# Altium schematic symbol library jlcpcb_2025_04_capacitors_extended_0603.schlib: 3668 symbols (part 6 of 20) (continued)
## AC0603KRX7R8BB222
designator C?  Capacitance: 2.2nF  (hidden comment: *)
Capacitor, Ceramic (MLCC), 2.2nF, ±10%, 25V, X7R, ±10%, SMD 0603; Manufacturer: YAGEO; Manufacturer Part Number: AC0603KRX7R8BB222; Package Size: 0603; JLCPCB Basic Part: No; JLCPCB Part Number: C3863730; Supplier 1: LCSC; Category: Capacitors - MLCC; Supplier Part Number 1: C3863730; Tolerance: ±10%; Voltage Rating: 25V; Temperature Coefficient: X7R; RoHS: Yes; ComponentLink1Description: Datasheet; ComponentLink1URL: https://wmsc.lcsc.com/wmsc/upload/file/pdf/v2/lcsc/2311211113_YAGEO-AC0603KRX7R8BB222_C3863730.pdf; ComponentLink2Description: JLCPCB Part URL; ComponentLink2URL: https://jlcpcb.com/partdetail/C3863730; ComponentLink3Description: LCSC Part URL; ComponentLink3URL: https://lcsc.com/product-detail/Multilayer-Ceramic-Capacitors-MLCC---SMD-SMT_YAGEO-YAGEO-AC0603KRX7R8BB222_C3863730.html
footprint CAP-0603 (0603 (1608M) Capacitor)
pins: 1, 2

## AC0603KRX7R8BB223
designator C?  Capacitance: 22nF  (hidden comment: *)
Capacitor, Ceramic (MLCC), 22nF, ±10%, 25V, X7R, ±10%, SMD 0603; Manufacturer: YAGEO; Manufacturer Part Number: AC0603KRX7R8BB223; Package Size: 0603; JLCPCB Basic Part: No; JLCPCB Part Number: C2180126; Supplier 1: LCSC; Category: Capacitors - MLCC; Supplier Part Number 1: C2180126; Tolerance: ±10%; Voltage Rating: 25V; Temperature Coefficient: X7R; RoHS: Yes; ComponentLink1Description: Datasheet; ComponentLink1URL: https://wmsc.lcsc.com/wmsc/upload/file/pdf/v2/lcsc/2202041100_YAGEO-AC0603KRX7R8BB223_C2180126.pdf; ComponentLink2Description: JLCPCB Part URL; ComponentLink2URL: https://jlcpcb.com/partdetail/C2180126; ComponentLink3Description: LCSC Part URL; ComponentLink3URL: https://lcsc.com/product-detail/Multilayer-Ceramic-Capacitors-MLCC---SMD-SMT_YAGEO-YAGEO-AC0603KRX7R8BB223_C2180126.html
footprint CAP-0603 (0603 (1608M) Capacitor)
pins: 1, 2

## AC0603KRX7R8BB224
designator C?  Capacitance: 220nF  (hidden comment: *)
Capacitor, Ceramic (MLCC), 220nF, ±10%, 25V, X7R, ±10%, SMD 0603; Manufacturer: YAGEO; Manufacturer Part Number: AC0603KRX7R8BB224; Package Size: 0603; JLCPCB Basic Part: No; JLCPCB Part Number: C726561; Supplier 1: LCSC; Category: Capacitors - MLCC; Supplier Part Number 1: C726561; Tolerance: ±10%; Voltage Rating: 25V; Temperature Coefficient: X7R; RoHS: Yes; ComponentLink1Description: Datasheet; ComponentLink1URL: https://wmsc.lcsc.com/wmsc/upload/file/pdf/v2/lcsc/2009181007_YAGEO-AC0603KRX7R8BB224_C726561.pdf; ComponentLink2Description: JLCPCB Part URL; ComponentLink2URL: https://jlcpcb.com/partdetail/C726561; ComponentLink3Description: LCSC Part URL; ComponentLink3URL: https://lcsc.com/product-detail/Multilayer-Ceramic-Capacitors-MLCC---SMD-SMT_YAGEO-YAGEO-AC0603KRX7R8BB224_C726561.html
footprint CAP-0603 (0603 (1608M) Capacitor)
pins: 1, 2

## AC0603KRX7R8BB472
designator C?  Capacitance: 4.7nF  (hidden comment: *)
Capacitor, Ceramic (MLCC), 4.7nF, ±10%, 25V, X7R, ±10%, SMD 0603; Manufacturer: YAGEO; Manufacturer Part Number: AC0603KRX7R8BB472; Package Size: 0603; JLCPCB Basic Part: No; JLCPCB Part Number: C2180916; Supplier 1: LCSC; Category: Capacitors - MLCC; Supplier Part Number 1: C2180916; Tolerance: ±10%; Voltage Rating: 25V; Temperature Coefficient: X7R; RoHS: Yes; ComponentLink1Description: Datasheet; ComponentLink1URL: https://wmsc.lcsc.com/wmsc/upload/file/pdf/v2/lcsc/2202041200_YAGEO-AC0603KRX7R8BB472_C2180916.pdf; ComponentLink2Description: JLCPCB Part URL; ComponentLink2URL: https://jlcpcb.com/partdetail/C2180916; ComponentLink3Description: LCSC Part URL; ComponentLink3URL: https://lcsc.com/product-detail/Multilayer-Ceramic-Capacitors-MLCC---SMD-SMT_YAGEO-YAGEO-AC0603KRX7R8BB472_C2180916.html
footprint CAP-0603 (0603 (1608M) Capacitor)
pins: 1, 2

## AC0603KRX7R8BB473
designator C?  Capacitance: 47nF  (hidden comment: *)
Capacitor, Ceramic (MLCC), 47nF, ±10%, 25V, X7R, ±10%, SMD 0603; Manufacturer: YAGEO; Manufacturer Part Number: AC0603KRX7R8BB473; Package Size: 0603; JLCPCB Basic Part: No; JLCPCB Part Number: C726562; Supplier 1: LCSC; Category: Capacitors - MLCC; Supplier Part Number 1: C726562; Tolerance: ±10%; Voltage Rating: 25V; Temperature Coefficient: X7R; RoHS: Yes; ComponentLink1Description: Datasheet; ComponentLink1URL: https://wmsc.lcsc.com/wmsc/upload/file/pdf/v2/lcsc/2010041434_YAGEO-AC0603KRX7R8BB473_C726562.pdf; ComponentLink2Description: JLCPCB Part URL; ComponentLink2URL: https://jlcpcb.com/partdetail/C726562; ComponentLink3Description: LCSC Part URL; ComponentLink3URL: https://lcsc.com/product-detail/Multilayer-Ceramic-Capacitors-MLCC---SMD-SMT_YAGEO-YAGEO-AC0603KRX7R8BB473_C726562.html
footprint CAP-0603 (0603 (1608M) Capacitor)
pins: 1, 2

## AC0603KRX7R9BB102
designator C?  Capacitance: 1nF  (hidden comment: *)
Capacitor, Ceramic (MLCC), 1nF, ±10%, 50V, X7R, ±10%, SMD 0603; Manufacturer: YAGEO; Manufacturer Part Number: AC0603KRX7R9BB102; Package Size: 0603; JLCPCB Basic Part: No; JLCPCB Part Number: C277475; Supplier 1: LCSC; Category: Capacitors - MLCC; Supplier Part Number 1: C277475; Tolerance: ±10%; Voltage Rating: 50V; Temperature Coefficient: X7R; RoHS: Yes; ComponentLink1Description: Datasheet; ComponentLink1URL: https://wmsc.lcsc.com/wmsc/upload/file/pdf/v2/lcsc/2304140030_YAGEO-AC0603KRX7R9BB102_C277475.pdf; ComponentLink2Description: JLCPCB Part URL; ComponentLink2URL: https://jlcpcb.com/partdetail/C277475; ComponentLink3Description: LCSC Part URL; ComponentLink3URL: https://lcsc.com/product-detail/Multilayer-Ceramic-Capacitors-MLCC---SMD-SMT_YAGEO-YAGEO-AC0603KRX7R9BB102_C277475.html
footprint CAP-0603 (0603 (1608M) Capacitor)
pins: 1, 2

## AC0603KRX7R9BB103
designator C?  Capacitance: 10nF  (hidden comment: *)
Capacitor, Ceramic (MLCC), 10nF, ±10%, 50V, X7R, ±10%, SMD 0603; Manufacturer: YAGEO; Manufacturer Part Number: AC0603KRX7R9BB103; Package Size: 0603; JLCPCB Basic Part: No; JLCPCB Part Number: C149618; Supplier 1: LCSC; Category: Capacitors - MLCC; Supplier Part Number 1: C149618; Tolerance: ±10%; Voltage Rating: 50V; Temperature Coefficient: X7R; RoHS: Yes; ComponentLink1Description: Datasheet; ComponentLink1URL: https://wmsc.lcsc.com/wmsc/upload/file/pdf/v2/lcsc/2304140030_YAGEO-AC0603KRX7R9BB103_C149618.pdf; ComponentLink2Description: JLCPCB Part URL; ComponentLink2URL: https://jlcpcb.com/partdetail/C149618; ComponentLink3Description: LCSC Part URL; ComponentLink3URL: https://lcsc.com/product-detail/Multilayer-Ceramic-Capacitors-MLCC---SMD-SMT_YAGEO-YAGEO-AC0603KRX7R9BB103_C149618.html
footprint CAP-0603 (0603 (1608M) Capacitor)
pins: 1, 2

## AC0603KRX7R9BB104
designator C?  Capacitance: 100nF  (hidden comment: *)
Capacitor, Ceramic (MLCC), 100nF, ±10%, 50V, X7R, ±10%, SMD 0603; Manufacturer: YAGEO; Manufacturer Part Number: AC0603KRX7R9BB104; Package Size: 0603; JLCPCB Basic Part: No; JLCPCB Part Number: C149620; Supplier 1: LCSC; Category: Capacitors - MLCC; Supplier Part Number 1: C149620; Tolerance: ±10%; Voltage Rating: 50V; Temperature Coefficient: X7R; RoHS: Yes; ComponentLink1Description: Datasheet; ComponentLink1URL: https://wmsc.lcsc.com/wmsc/upload/file/pdf/v2/lcsc/1811082127_YAGEO-AC0603KRX7R9BB104_C149620.pdf; ComponentLink2Description: JLCPCB Part URL; ComponentLink2URL: https://jlcpcb.com/partdetail/C149620; ComponentLink3Description: LCSC Part URL; ComponentLink3URL: https://lcsc.com/product-detail/Multilayer-Ceramic-Capacitors-MLCC---SMD-SMT_YAGEO-YAGEO-AC0603KRX7R9BB104_C149620.html
footprint CAP-0603 (0603 (1608M) Capacitor)
pins: 1, 2

## AC0603KRX7R9BB122
designator C?  Capacitance: 1.2nF  (hidden comment: *)
Capacitor, Ceramic (MLCC), 1.2nF, ±10%, 50V, X7R, ±10%, SMD 0603; Manufacturer: YAGEO; Manufacturer Part Number: AC0603KRX7R9BB122; Package Size: 0603; JLCPCB Basic Part: No; JLCPCB Part Number: C3001871; Supplier 1: LCSC; Category: Capacitors - MLCC; Supplier Part Number 1: C3001871; Tolerance: ±10%; Voltage Rating: 50V; Temperature Coefficient: X7R; RoHS: Yes; ComponentLink1Description: Datasheet; ComponentLink1URL: https://wmsc.lcsc.com/wmsc/upload/file/pdf/v2/lcsc/2205091745_YAGEO-AC0603KRX7R9BB122_C3001871.pdf; ComponentLink2Description: JLCPCB Part URL; ComponentLink2URL: https://jlcpcb.com/partdetail/C3001871; ComponentLink3Description: LCSC Part URL; ComponentLink3URL: https://lcsc.com/product-detail/Multilayer-Ceramic-Capacitors-MLCC---SMD-SMT_YAGEO-YAGEO-AC0603KRX7R9BB122_C3001871.html
footprint CAP-0603 (0603 (1608M) Capacitor)
pins: 1, 2

## AC0603KRX7R9BB123
designator C?  Capacitance: 12nF  (hidden comment: *)
Capacitor, Ceramic (MLCC), 12nF, ±10%, 50V, X7R, ±10%, SMD 0603; Manufacturer: YAGEO; Manufacturer Part Number: AC0603KRX7R9BB123; Package Size: 0603; JLCPCB Basic Part: No; JLCPCB Part Number: C3886748; Supplier 1: LCSC; Category: Capacitors - MLCC; Supplier Part Number 1: C3886748; Tolerance: ±10%; Voltage Rating: 50V; Temperature Coefficient: X7R; RoHS: Yes; ComponentLink1Description: Datasheet; ComponentLink1URL: https://wmsc.lcsc.com/wmsc/upload/file/pdf/v2/lcsc/2311211113_YAGEO-AC0603KRX7R9BB123_C3886748.pdf; ComponentLink2Description: JLCPCB Part URL; ComponentLink2URL: https://jlcpcb.com/partdetail/C3886748; ComponentLink3Description: LCSC Part URL; ComponentLink3URL: https://lcsc.com/product-detail/Multilayer-Ceramic-Capacitors-MLCC---SMD-SMT_YAGEO-YAGEO-AC0603KRX7R9BB123_C3886748.html
footprint CAP-0603 (0603 (1608M) Capacitor)
pins: 1, 2

## AC0603KRX7R9BB152
designator C?  Capacitance: 1.5nF  (hidden comment: *)
Capacitor, Ceramic (MLCC), 1.5nF, ±10%, 50V, X7R, ±10%, SMD 0603; Manufacturer: YAGEO; Manufacturer Part Number: AC0603KRX7R9BB152; Package Size: 0603; JLCPCB Basic Part: No; JLCPCB Part Number: C327110; Supplier 1: LCSC; Category: Capacitors - MLCC; Supplier Part Number 1: C327110; Tolerance: ±10%; Voltage Rating: 50V; Temperature Coefficient: X7R; RoHS: Yes; ComponentLink1Description: Datasheet; ComponentLink1URL: https://wmsc.lcsc.com/wmsc/upload/file/pdf/v2/lcsc/1811141225_YAGEO-AC0603KRX7R9BB152_C327110.pdf; ComponentLink2Description: JLCPCB Part URL; ComponentLink2URL: https://jlcpcb.com/partdetail/C327110; ComponentLink3Description: LCSC Part URL; ComponentLink3URL: https://lcsc.com/product-detail/Multilayer-Ceramic-Capacitors-MLCC---SMD-SMT_YAGEO-YAGEO-AC0603KRX7R9BB152_C327110.html
footprint CAP-0603 (0603 (1608M) Capacitor)
pins: 1, 2

## AC0603KRX7R9BB153
designator C?  Capacitance: 15nF  (hidden comment: *)
Capacitor, Ceramic (MLCC), 15nF, ±10%, 50V, X7R, ±10%, SMD 0603; Manufacturer: YAGEO; Manufacturer Part Number: AC0603KRX7R9BB153; Package Size: 0603; JLCPCB Basic Part: No; JLCPCB Part Number: C726563; Supplier 1: LCSC; Category: Capacitors - MLCC; Supplier Part Number 1: C726563; Tolerance: ±10%; Voltage Rating: 50V; Temperature Coefficient: X7R; RoHS: Yes; ComponentLink1Description: Datasheet; ComponentLink1URL: https://wmsc.lcsc.com/wmsc/upload/file/pdf/v2/lcsc/2105241336_YAGEO-AC0603KRX7R9BB153_C726563.pdf; ComponentLink2Description: JLCPCB Part URL; ComponentLink2URL: https://jlcpcb.com/partdetail/C726563; ComponentLink3Description: LCSC Part URL; ComponentLink3URL: https://lcsc.com/product-detail/Multilayer-Ceramic-Capacitors-MLCC---SMD-SMT_YAGEO-YAGEO-AC0603KRX7R9BB153_C726563.html
footprint CAP-0603 (0603 (1608M) Capacitor)
pins: 1, 2

## AC0603KRX7R9BB182
designator C?  Capacitance: 1.8nF  (hidden comment: *)
Capacitor, Ceramic (MLCC), 1.8nF, ±10%, 50V, X7R, ±10%, SMD 0603; Manufacturer: YAGEO; Manufacturer Part Number: AC0603KRX7R9BB182; Package Size: 0603; JLCPCB Basic Part: No; JLCPCB Part Number: C2196737; Supplier 1: LCSC; Category: Capacitors - MLCC; Supplier Part Number 1: C2196737; Tolerance: ±10%; Voltage Rating: 50V; Temperature Coefficient: X7R; RoHS: Yes; ComponentLink1Description: Datasheet; ComponentLink1URL: https://wmsc.lcsc.com/wmsc/upload/file/pdf/v2/lcsc/2304140030_YAGEO-AC0603KRX7R9BB182_C2196737.pdf; ComponentLink2Description: JLCPCB Part URL; ComponentLink2URL: https://jlcpcb.com/partdetail/C2196737; ComponentLink3Description: LCSC Part URL; ComponentLink3URL: https://lcsc.com/product-detail/Multilayer-Ceramic-Capacitors-MLCC---SMD-SMT_YAGEO-YAGEO-AC0603KRX7R9BB182_C2196737.html
footprint CAP-0603 (0603 (1608M) Capacitor)
pins: 1, 2

## AC0603KRX7R9BB222
designator C?  Capacitance: 2.2nF  (hidden comment: *)
Capacitor, Ceramic (MLCC), 2.2nF, ±10%, 50V, X7R, ±10%, SMD 0603; Manufacturer: YAGEO; Manufacturer Part Number: AC0603KRX7R9BB222; Package Size: 0603; JLCPCB Basic Part: No; JLCPCB Part Number: C309442; Supplier 1: LCSC; Category: Capacitors - MLCC; Supplier Part Number 1: C309442; Tolerance: ±10%; Voltage Rating: 50V; Temperature Coefficient: X7R; RoHS: Yes; ComponentLink1Description: Datasheet; ComponentLink1URL: https://wmsc.lcsc.com/wmsc/upload/file/pdf/v2/lcsc/1811082016_YAGEO-AC0603KRX7R9BB222_C309442.pdf; ComponentLink2Description: JLCPCB Part URL; ComponentLink2URL: https://jlcpcb.com/partdetail/C309442; ComponentLink3Description: LCSC Part URL; ComponentLink3URL: https://lcsc.com/product-detail/Multilayer-Ceramic-Capacitors-MLCC---SMD-SMT_YAGEO-YAGEO-AC0603KRX7R9BB222_C309442.html
footprint CAP-0603 (0603 (1608M) Capacitor)
pins: 1, 2

## AC0603KRX7R9BB223
designator C?  Capacitance: 22nF  (hidden comment: *)
Capacitor, Ceramic (MLCC), 22nF, ±10%, 50V, X7R, ±10%, SMD 0603; Manufacturer: YAGEO; Manufacturer Part Number: AC0603KRX7R9BB223; Package Size: 0603; JLCPCB Basic Part: No; JLCPCB Part Number: C389111; Supplier 1: LCSC; Category: Capacitors - MLCC; Supplier Part Number 1: C389111; Tolerance: ±10%; Voltage Rating: 50V; Temperature Coefficient: X7R; RoHS: Yes; ComponentLink1Description: Datasheet; ComponentLink1URL: https://wmsc.lcsc.com/wmsc/upload/file/pdf/v2/lcsc/1912111437_YAGEO-AC0603KRX7R9BB223_C389111.pdf; ComponentLink2Description: JLCPCB Part URL; ComponentLink2URL: https://jlcpcb.com/partdetail/C389111; ComponentLink3Description: LCSC Part URL; ComponentLink3URL: https://lcsc.com/product-detail/Multilayer-Ceramic-Capacitors-MLCC---SMD-SMT_YAGEO-YAGEO-AC0603KRX7R9BB223_C389111.html
footprint CAP-0603 (0603 (1608M) Capacitor)
pins: 1, 2

## AC0603KRX7R9BB224
designator C?  Capacitance: 220nF  (hidden comment: *)
Capacitor, Ceramic (MLCC), 220nF, ±10%, 50V, X7R, ±10%, SMD 0603; Manufacturer: YAGEO; Manufacturer Part Number: AC0603KRX7R9BB224; Package Size: 0603; JLCPCB Basic Part: No; JLCPCB Part Number: C726565; Supplier 1: LCSC; Category: Capacitors - MLCC; Supplier Part Number 1: C726565; Tolerance: ±10%; Voltage Rating: 50V; Temperature Coefficient: X7R; RoHS: Yes; ComponentLink1Description: Datasheet; ComponentLink1URL: https://wmsc.lcsc.com/wmsc/upload/file/pdf/v2/lcsc/2010202005_YAGEO-AC0603KRX7R9BB224_C726565.pdf; ComponentLink2Description: JLCPCB Part URL; ComponentLink2URL: https://jlcpcb.com/partdetail/C726565; ComponentLink3Description: LCSC Part URL; ComponentLink3URL: https://lcsc.com/product-detail/Multilayer-Ceramic-Capacitors-MLCC---SMD-SMT_YAGEO-YAGEO-AC0603KRX7R9BB224_C726565.html
footprint CAP-0603 (0603 (1608M) Capacitor)
pins: 1, 2

## AC0603KRX7R9BB273
designator C?  Capacitance: 27nF  (hidden comment: *)
Capacitor, Ceramic (MLCC), 27nF, ±10%, 50V, X7R, ±10%, SMD 0603; Manufacturer: YAGEO; Manufacturer Part Number: AC0603KRX7R9BB273; Package Size: 0603; JLCPCB Basic Part: No; JLCPCB Part Number: C726566; Supplier 1: LCSC; Category: Capacitors - MLCC; Supplier Part Number 1: C726566; Tolerance: ±10%; Voltage Rating: 50V; Temperature Coefficient: X7R; RoHS: Yes; ComponentLink1Description: Datasheet; ComponentLink1URL: https://wmsc.lcsc.com/wmsc/upload/file/pdf/v2/lcsc/2011221205_YAGEO-AC0603KRX7R9BB273_C726566.pdf; ComponentLink2Description: JLCPCB Part URL; ComponentLink2URL: https://jlcpcb.com/partdetail/C726566; ComponentLink3Description: LCSC Part URL; ComponentLink3URL: https://lcsc.com/product-detail/Multilayer-Ceramic-Capacitors-MLCC---SMD-SMT_YAGEO-YAGEO-AC0603KRX7R9BB273_C726566.html
footprint CAP-0603 (0603 (1608M) Capacitor)
pins: 1, 2

## AC0603KRX7R9BB332
designator C?  Capacitance: 3.3nF  (hidden comment: *)
Capacitor, Ceramic (MLCC), 3.3nF, ±10%, 50V, X7R, ±10%, SMD 0603; Manufacturer: YAGEO; Manufacturer Part Number: AC0603KRX7R9BB332; Package Size: 0603; JLCPCB Basic Part: No; JLCPCB Part Number: C605207; Supplier 1: LCSC; Category: Capacitors - MLCC; Supplier Part Number 1: C605207; Tolerance: ±10%; Voltage Rating: 50V; Temperature Coefficient: X7R; RoHS: Yes; ComponentLink1Description: Datasheet; ComponentLink1URL: https://wmsc.lcsc.com/wmsc/upload/file/pdf/v2/lcsc/2304140030_YAGEO-AC0603KRX7R9BB332_C605207.pdf; ComponentLink2Description: JLCPCB Part URL; ComponentLink2URL: https://jlcpcb.com/partdetail/C605207; ComponentLink3Description: LCSC Part URL; ComponentLink3URL: https://lcsc.com/product-detail/Multilayer-Ceramic-Capacitors-MLCC---SMD-SMT_YAGEO-YAGEO-AC0603KRX7R9BB332_C605207.html
footprint CAP-0603 (0603 (1608M) Capacitor)
pins: 1, 2

## AC0603KRX7R9BB333
designator C?  Capacitance: 33nF  (hidden comment: *)
Capacitor, Ceramic (MLCC), 33nF, ±10%, 50V, X7R, ±10%, SMD 0603; Manufacturer: YAGEO; Manufacturer Part Number: AC0603KRX7R9BB333; Package Size: 0603; JLCPCB Basic Part: No; JLCPCB Part Number: C513581; Supplier 1: LCSC; Category: Capacitors - MLCC; Supplier Part Number 1: C513581; Tolerance: ±10%; Voltage Rating: 50V; Temperature Coefficient: X7R; RoHS: Yes; ComponentLink1Description: Datasheet; ComponentLink1URL: https://wmsc.lcsc.com/wmsc/upload/file/pdf/v2/lcsc/2201041830_YAGEO-AC0603KRX7R9BB333_C513581.pdf; ComponentLink2Description: JLCPCB Part URL; ComponentLink2URL: https://jlcpcb.com/partdetail/C513581; ComponentLink3Description: LCSC Part URL; ComponentLink3URL: https://lcsc.com/product-detail/Multilayer-Ceramic-Capacitors-MLCC---SMD-SMT_YAGEO-YAGEO-AC0603KRX7R9BB333_C513581.html
footprint CAP-0603 (0603 (1608M) Capacitor)
pins: 1, 2

## AC0603KRX7R9BB472
designator C?  Capacitance: 4.7nF  (hidden comment: *)
Capacitor, Ceramic (MLCC), 4.7nF, ±10%, 50V, X7R, ±10%, SMD 0603; Manufacturer: YAGEO; Manufacturer Part Number: AC0603KRX7R9BB472; Package Size: 0603; JLCPCB Basic Part: No; JLCPCB Part Number: C149615; Supplier 1: LCSC; Category: Capacitors - MLCC; Supplier Part Number 1: C149615; Tolerance: ±10%; Voltage Rating: 50V; Temperature Coefficient: X7R; RoHS: Yes; ComponentLink1Description: Datasheet; ComponentLink1URL: https://wmsc.lcsc.com/wmsc/upload/file/pdf/v2/lcsc/2304140030_YAGEO-AC0603KRX7R9BB472_C149615.pdf; ComponentLink2Description: JLCPCB Part URL; ComponentLink2URL: https://jlcpcb.com/partdetail/C149615; ComponentLink3Description: LCSC Part URL; ComponentLink3URL: https://lcsc.com/product-detail/Multilayer-Ceramic-Capacitors-MLCC---SMD-SMT_YAGEO-YAGEO-AC0603KRX7R9BB472_C149615.html
footprint CAP-0603 (0603 (1608M) Capacitor)
pins: 1, 2

## AC0603KRX7R9BB473
designator C?  Capacitance: 47nF  (hidden comment: *)
Capacitor, Ceramic (MLCC), 47nF, ±10%, 50V, X7R, ±10%, SMD 0603; Manufacturer: YAGEO; Manufacturer Part Number: AC0603KRX7R9BB473; Package Size: 0603; JLCPCB Basic Part: No; JLCPCB Part Number: C389105; Supplier 1: LCSC; Category: Capacitors - MLCC; Supplier Part Number 1: C389105; Tolerance: ±10%; Voltage Rating: 50V; Temperature Coefficient: X7R; RoHS: Yes; ComponentLink1Description: Datasheet; ComponentLink1URL: https://wmsc.lcsc.com/wmsc/upload/file/pdf/v2/lcsc/2304140030_YAGEO-AC0603KRX7R9BB473_C389105.pdf; ComponentLink2Description: JLCPCB Part URL; ComponentLink2URL: https://jlcpcb.com/partdetail/C389105; ComponentLink3Description: LCSC Part URL; ComponentLink3URL: https://lcsc.com/product-detail/Multilayer-Ceramic-Capacitors-MLCC---SMD-SMT_YAGEO-YAGEO-AC0603KRX7R9BB473_C389105.html
footprint CAP-0603 (0603 (1608M) Capacitor)
pins: 1, 2

## AC0603KRX7R9BB562
designator C?  Capacitance: 5.6nF  (hidden comment: *)
Capacitor, Ceramic (MLCC), 5.6nF, ±10%, 50V, X7R, ±10%, SMD 0603; Manufacturer: YAGEO; Manufacturer Part Number: AC0603KRX7R9BB562; Package Size: 0603; JLCPCB Basic Part: No; JLCPCB Part Number: C2196728; Supplier 1: LCSC; Category: Capacitors - MLCC; Supplier Part Number 1: C2196728; Tolerance: ±10%; Voltage Rating: 50V; Temperature Coefficient: X7R; RoHS: Yes; ComponentLink1Description: Datasheet; ComponentLink1URL: https://wmsc.lcsc.com/wmsc/upload/file/pdf/v2/lcsc/2304140030_YAGEO-AC0603KRX7R9BB562_C2196728.pdf; ComponentLink2Description: JLCPCB Part URL; ComponentLink2URL: https://jlcpcb.com/partdetail/C2196728; ComponentLink3Description: LCSC Part URL; ComponentLink3URL: https://lcsc.com/product-detail/Multilayer-Ceramic-Capacitors-MLCC---SMD-SMT_YAGEO-YAGEO-AC0603KRX7R9BB562_C2196728.html
footprint CAP-0603 (0603 (1608M) Capacitor)
pins: 1, 2

## AC0603KRX7R9BB682
designator C?  Capacitance: 6.8nF  (hidden comment: *)
Capacitor, Ceramic (MLCC), 6.8nF, ±10%, 50V, X7R, ±10%, SMD 0603; Manufacturer: YAGEO; Manufacturer Part Number: AC0603KRX7R9BB682; Package Size: 0603; JLCPCB Basic Part: No; JLCPCB Part Number: C327112; Supplier 1: LCSC; Category: Capacitors - MLCC; Supplier Part Number 1: C327112; Tolerance: ±10%; Voltage Rating: 50V; Temperature Coefficient: X7R; RoHS: Yes; ComponentLink1Description: Datasheet; ComponentLink1URL: https://wmsc.lcsc.com/wmsc/upload/file/pdf/v2/lcsc/1811141225_YAGEO-AC0603KRX7R9BB682_C327112.pdf; ComponentLink2Description: JLCPCB Part URL; ComponentLink2URL: https://jlcpcb.com/partdetail/C327112; ComponentLink3Description: LCSC Part URL; ComponentLink3URL: https://lcsc.com/product-detail/Multilayer-Ceramic-Capacitors-MLCC---SMD-SMT_YAGEO-YAGEO-AC0603KRX7R9BB682_C327112.html
footprint CAP-0603 (0603 (1608M) Capacitor)
pins: 1, 2

## AC0603KRX7R9BB683
designator C?  Capacitance: 68nF  (hidden comment: *)
Capacitor, Ceramic (MLCC), 68nF, ±10%, 50V, X7R, ±10%, SMD 0603; Manufacturer: YAGEO; Manufacturer Part Number: AC0603KRX7R9BB683; Package Size: 0603; JLCPCB Basic Part: No; JLCPCB Part Number: C726567; Supplier 1: LCSC; Category: Capacitors - MLCC; Supplier Part Number 1: C726567; Tolerance: ±10%; Voltage Rating: 50V; Temperature Coefficient: X7R; RoHS: Yes; ComponentLink1Description: Datasheet; ComponentLink1URL: https://wmsc.lcsc.com/wmsc/upload/file/pdf/v2/lcsc/2009191609_YAGEO-AC0603KRX7R9BB683_C726567.pdf; ComponentLink2Description: JLCPCB Part URL; ComponentLink2URL: https://jlcpcb.com/partdetail/C726567; ComponentLink3Description: LCSC Part URL; ComponentLink3URL: https://lcsc.com/product-detail/Multilayer-Ceramic-Capacitors-MLCC---SMD-SMT_YAGEO-YAGEO-AC0603KRX7R9BB683_C726567.html
footprint CAP-0603 (0603 (1608M) Capacitor)
pins: 1, 2

## AM03B102K500AT
designator C?  Capacitance: 1nF  (hidden comment: *)
Capacitor, Ceramic (MLCC), 1nF, ±10%, null, X7R, ±10%, SMD 0603; Manufacturer: FH (Guangdong Fenghua Advanced Tech); Manufacturer Part Number: AM03B102K500AT; Package Size: 0603; JLCPCB Basic Part: No; JLCPCB Part Number: C5204939; Supplier 1: LCSC; Category: Capacitors - MLCC; Supplier Part Number 1: C5204939; Tolerance: ±10%; Voltage Rating: null; Temperature Coefficient: X7R; RoHS: Yes; ComponentLink1Description: Datasheet; ComponentLink1URL: https://wmsc.lcsc.com/wmsc/upload/file/pdf/v2/lcsc/2212222008_FH--Guangdong-Fenghua-Advanced-Tech-AM03B102K500AT_C5204939.pdf; ComponentLink2Description: JLCPCB Part URL; ComponentLink2URL: https://jlcpcb.com/partdetail/C5204939; ComponentLink3Description: LCSC Part URL; ComponentLink3URL: https://lcsc.com/product-detail/Multilayer-Ceramic-Capacitors-MLCC---SMD-SMT_FH-Guangdong-Fenghua-Advanced-Tech-FH-Guangdong-Fenghua-Advanced-Tech-AM03B102K500AT_C5204939.html
footprint CAP-0603 (0603 (1608M) Capacitor)
pins: 1, 2

## AM03B103K500AT
designator C?  Capacitance: 10000pF  (hidden comment: *)
Capacitor, Ceramic (MLCC), 10000pF, ±10%, null, X7R, ±10%, SMD 0603; Manufacturer: FH (Guangdong Fenghua Advanced Tech); Manufacturer Part Number: AM03B103K500AT; Package Size: 0603; JLCPCB Basic Part: No; JLCPCB Part Number: C5204935; Supplier 1: LCSC; Category: Capacitors - MLCC; Supplier Part Number 1: C5204935; Tolerance: ±10%; Voltage Rating: null; Temperature Coefficient: X7R; RoHS: Yes; ComponentLink1Description: Datasheet; ComponentLink1URL: https://wmsc.lcsc.com/wmsc/upload/file/pdf/v2/lcsc/2212021230_FH--Guangdong-Fenghua-Advanced-Tech-AM03B103K500AT_C5204935.pdf; ComponentLink2Description: JLCPCB Part URL; ComponentLink2URL: https://jlcpcb.com/partdetail/C5204935; ComponentLink3Description: LCSC Part URL; ComponentLink3URL: https://lcsc.com/product-detail/Multilayer-Ceramic-Capacitors-MLCC---SMD-SMT_FH-Guangdong-Fenghua-Advanced-Tech-FH-Guangdong-Fenghua-Advanced-Tech-AM03B103K500AT_C5204935.html
footprint CAP-0603 (0603 (1608M) Capacitor)
pins: 1, 2
